# Altium footprint library Custom_Library.PcbLib: 221 footprints (part 11 of 14)
Each footprint in its own frame and in the unit in brackets; x right, y up, seen from the top. Pads: shape width x height; smd on the part's side, far side on the other; paste and mask are expansions set on the pad; w line width, h text height; cw(c..) or ccw(c..) is an arc to the next point about the centre after c.
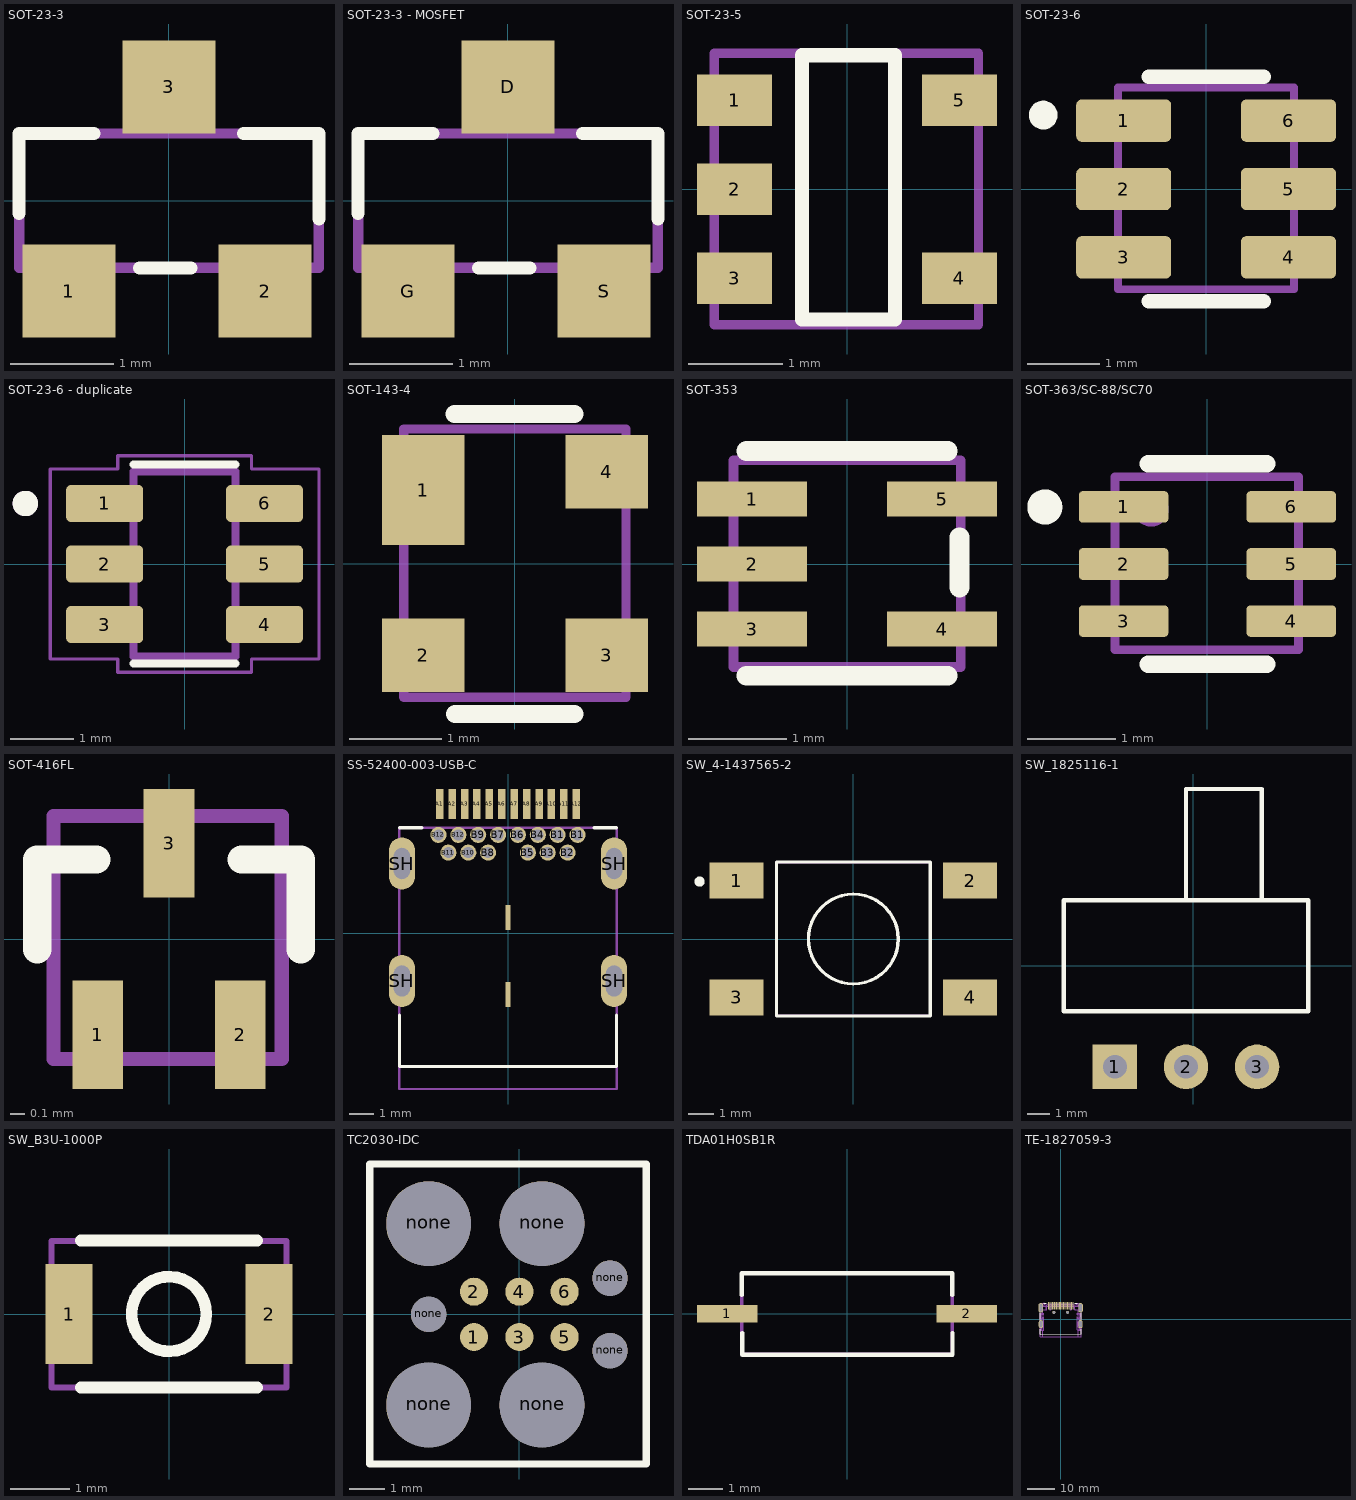
[diagram p10: the footprints below, top view; thin cyan lines are the x and y axes]

## SOT-23-3 [mm]
pads (3):
  rect 0.9x0.9 smd: 1(-0.969,-0.876) 2(0.931,-0.876) 3(0,1.1)
Top Overlay:
  lines w0.127: -1.451,-0.126 -1.451,0.65 -0.725,0.65 ; -0.285,-0.655 0.215,-0.655 ; 0.725,0.65 1.454,0.65 1.454,-0.176
Top Assembly:
  lines w0.1: -1.45,-0.65 -1.45,0.65 1.45,0.65 1.45,-0.65 -1.45,-0.65
  text "'.Designator'" at -3.1,-2.5 h1.27
3D body "SOT23.STEP": height 1.2, standoff -0.02, extent -1.513,-1.11 1.487,1.142

## SOT-23-3 - MOSFET [mm]
pads (3):
  rect 0.9x0.9 smd: D(0,1.1) G(-0.969,-0.876) S(0.931,-0.876)
Top Overlay:
  lines w0.127: -1.451,-0.126 -1.451,0.65 -0.725,0.65 ; -0.285,-0.655 0.215,-0.655 ; 0.725,0.65 1.454,0.65 1.454,-0.176
Top Assembly:
  lines w0.1: -1.45,-0.65 -1.45,0.65 1.45,0.65 1.45,-0.65 -1.45,-0.65
  text "'.Designator'" at -3.1,-2.5 h1.27
3D body "SOT23.STEP": height 1.2, standoff -0.02, extent -1.513,-1.11 1.487,1.142

## SOT-23-5 [mm] "SOT23, 5-Leads, Body 3.00x2.85mm, Pitch 0.95mm, IPC Medium Density"
height 1.3
pads (5):
  rect 0.8x0.55 smd: 1(-1.2,0.95) 2(-1.2,0) 3(-1.2,-0.95) 4(1.2,-0.95) 5(1.2,0.95)
Top Overlay:
  lines w0.15: -0.48,-1.39 -0.48,1.43 0.51,1.43 0.51,-1.39 -0.48,-1.39
Top Assembly:
  lines w0.1: -1.415,-1.445 1.402,-1.445 1.402,1.451 -1.415,1.451 -1.415,-1.445
  text "'.Designator'" at -2.937,-2.49 h1.27
3D body "SOT-23-5.STEP": height 1.5, standoff 0, extent -1.41,-1.45 1.411,1.45

## SOT-23-6 [mm]
pads (6):
  rrect25% 1.32x0.59 smd: 1(-1.145,0.95) 2(-1.145,0) 3(-1.145,-0.95) 4(1.145,-0.95) 5(1.145,0) 6(1.145,0.95)
Top Overlay:
  circle w0.2: c-2.264,1.027 r0.1
  lines w0.2: -0.8,-1.56 0.8,-1.56 ; -0.8,1.56 0.8,1.56
Top Assembly:
  circle w0.2: c-0.793,0.967 r0.1
  lines w0.11: -1.222,-1.393 1.221,-1.393 1.221,1.413 -1.207,1.413 -1.222,1.413 -1.222,-1.393
  text "'.Designator'" at -3.613,-2.754 h1.27
3D body "User Library-SOT23-6-1.STEP": height 1.09, standoff 0, extent -1.211,-1.389 1.215,1.405

## SOT-23-6 - duplicate [mm] "0.075-1.7A adj. ILIMIT, 2.5-6.5V, 85mΩ USB power switch, active-high, reverse blocking"
pads (6):
  rrect25% 1.21x0.58 smd: 1(-1.255,0.95) 2(-1.255,0) 3(-1.255,-0.95) 4(1.255,-0.95) 5(1.255,0) 6(1.255,0.95)
Top Overlay:
  circle w0.2: c-2.5,0.95 r0.1
  lines w0.127: -0.8,-1.56 0.8,-1.56 ; -0.8,1.56 0.8,1.56
Mechanical 13:
  circle w0.2: c-2.5,0.95 r0.1
  lines w0.127: -0.8,-1.45 -0.8,1.45 0.8,1.45 0.8,-1.45 -0.8,-1.45
Mechanical 15:
  lines w0.05: -2.11,-1.49 -2.11,1.49 -1.05,1.49 -1.05,1.7 1.05,1.7 1.05,1.49 2.11,1.49 2.11,-1.49 1.05,-1.49 1.05,-1.7 -1.05,-1.7 -1.05,-1.49 -2.11,-1.49
3D body "step_temp.STEP": height 1.45, standoff 0, extent -1.4,-1.45 1.4,1.45

## SOT-143-4 [mm]
pads (4):
  rect 0.9x1.2 smd: 1(-1,0.8)
  rect 0.9x0.8 smd: 2(-1,-1) 3(1,-1) 4(1,1)
Top Overlay:
  lines w0.2: -0.654,1.63 0.646,1.63 ; -0.65,-1.639 0.65,-1.639
Top Assembly:
  lines w0.1: -1.211,-1.457 1.21,-1.457 1.21,1.468 0.006,1.468 -1.211,1.468 -1.211,-1.457
  text "'.Designator'" at -3.013,-2.754 h1.27
3D body "User Library-sot143.STEP": height 1, standoff 0, extent -1.21,-1.46 1.21,1.46

## SOT-353 [mil]
pads (5):
  rect 44x14 smd: 1(-38,26) 2(-38,0) 3(-38,-26) 4(38,-26) 5(38,26)
Top Overlay:
  lines w7.87: -40.17,-44.71 40.27,-44.71 ; -40.17,45.2 40.27,45.2 ; 45.02,-9.43 45.02,10.68
Top Assembly:
  lines w3.94: -45.44,-41.22 45.53,-41.22 45.53,41.49 -45.44,41.49 -45.44,-41.22
  text "'.Designator'" at -135.3,-87.89 h50
3D body "User Library-sot353.STEP": height 39.37, standoff 0, extent -45.28,-41.34 45.28,41.34

## SOT-363/SC-88/SC70 [mm]
pads (6):
  rrect25% 1.02x0.36 smd: 1(-0.955,0.65) 2(-0.955,0) 3(-0.955,-0.65) 4(0.955,-0.65) 5(0.955,0) 6(0.955,0.65)
Top Overlay:
  circle w0.2: c-1.852,0.648 r0.1
  lines w0.2: -0.675,-1.144 0.675,-1.144 ; -0.675,1.144 0.675,1.144
Top Assembly:
  circle w0.2: c-0.643,0.626 r0.1
  lines w0.1: -1.054,-0.976 -1.054,0.995 0.839,0.995 1.037,0.995 1.037,-0.976 -1.054,-0.976
  text "'.Designator'" at -3.185,-2.438 h1.27
3D body "NCS210SQT2G.STEP": height 1, standoff -0.1, extent -1.05,-1 1.05,1

## SOT-416FL [mil]
pads (3):
  rect 14x30 smd paste+0: 1(-19.68,-26.5) 2(19.68,-26.5) 3(0,26.5)
Top Overlay:
  lines w7.87: -36.5,-2.82 -36.5,22 -20.1,22 ; 20.1,22 36.5,22 36.5,-2.82
Top Assembly:
  lines w3.94: -31.97,-33.23 -31.97,34.02 31.22,34.02 31.22,-33.23 -31.97,-33.23
  text "'.Designator'" at -122.95,-84.13 h50
3D body "TRANS_2SC4617EB_ROM.step": height 35.12, standoff 0, extent -31.5,-33.5 31.5,33.5
3D body: height 10, standoff 0, extent 0,0 10,10

## SS-52400-003-USB-C [mm]
pads (32):
  rect 0.3x1.2 smd: A1(-2.75,5.21) A2(-2.25,5.21) A3(-1.75,5.21) A4(-1.25,5.21) A5(-0.75,5.21) A6(-0.25,5.21) A7(0.25,5.21) A8(0.75,5.21) A9(1.25,5.21) A10(1.75,5.21) A11(2.25,5.21) A12(2.75,5.21)
  round 0.65 hole 0.45: B1(2,3.96) B1(2.8,3.96) B2(2.4,3.25) B3(1.6,3.25) B4(1.2,3.96) B5(0.8,3.25) B6(0.4,3.96) B7(-0.4,3.96) B8(-0.8,3.25) B9(-1.2,3.96) B10(-1.6,3.25) B11(-2.4,3.25) B12(-2.8,3.96) B12(-2,3.96)
  oval 1.05x2.1 hole 0.65 slot 1.25 at 90 deg: SH(-4.27,-1.92) SH(-4.27,2.81) SH(4.27,-1.92) SH(4.27,2.81)
  rect 0.2x1 smd: SH(0,-2.47) SH(0,0.63)
Top Overlay:
  lines w0.127: -4.37,-3.29 -4.37,-5.37 4.37,-5.37 4.37,-3.29 ; -4.37,4.247 -3.47,4.247 ; 3.47,4.247 4.37,4.247
Top Assembly:
  lines w0.1: -4.37,-3.77 -4.37,4.255 3.271,4.255 4.37,4.255 4.37,-3.77 4.37,-6.27 -4.37,-6.27 -4.37,-3.448 ; -4.358,-5.371 4.337,-5.366
  text "'.Designator'" at -3.209,-7.464 h1.27
3D body "SS-52400-003--3DModel-STEP-56544.STEP": height 3.04, standoff -1.82, extent -4.37,-6.311 4.37,5.519

## SW_4-1437565-2 [mm]
pads (4):
  rect 2.1x1.4 smd: 1(-4.55,2.275) 2(4.55,2.275) 3(-4.55,-2.275) 4(4.55,-2.275)
Top Overlay:
  circle w0.127: c0,0 r1.75
  circle w0.2: c-5.995,2.237 r0.1
  lines w0.127: -3,-2.997 -3,2.997 3.002,2.997 3.002,-3 -2.992,-3
Top Assembly:
  lines w0.1: -3,-3 3,-3 3,3 -3,3 -3,-3
  text "'.Designator'" at -3.286,-4.739 h1.27
3D body "FSM4JSMATR--3DModel-STEP-56544.STEP": height 5.18, standoff 0.05, extent -5,-3 5,3

## SW_1825116-1 [mm]
pads (3):
  rect 2x2 hole 1.07: 1(-3.516,-4.547)
  round 2 hole 1.07: 2(-0.316,-4.547) 3(2.884,-4.547)
Top Overlay:
  lines w0.2: -0.316,3.073 -0.316,7.953 3.084,7.953 3.084,3.073 ; 0.764,-2.047 1.814,-2.047 ; -5.816,-2.047 5.184,-2.047 5.184,2.953 -5.816,2.953 -5.816,-2.047
3D body "1825116-1.stp": height 5.7, standoff -4.07, extent -5.824,-4.778 5.176,7.722

## SW_B3U-1000P [mm]
pads (2):
  rect 0.8x1.7 smd: 1(-1.7,0) 2(1.7,0)
Top Overlay:
  circle w0.2: c0,0 r0.635
  lines w0.2: -1.5,-1.25 1.5,-1.25 ; -1.5,1.25 1.5,1.25
Top Assembly:
  lines w0.1: -2,0.46 -1.999,0.46 -1.999,-1.25 0.648,-1.25 2,-1.25 2,0.41 2,1.24 -2,1.24 -2,0.46
  text "'.Designator'" at -3.202,-2.481 h1.27
3D body "B3U-1000P--3DModel-STEP-56544.STEP": height 1.75, standoff 0, extent -2,-1.25 2,1.25

## TC2030-IDC [mil]
pads (13):
  round 31 smd paste-39.37: 1(-50,-25) 2(-50,25) 3(0,-25) 4(0,25) 5(50,-25) 6(50,25)
  round 93.5 hole 93.5 unplated: none(-100,-100) none(-100,100) none(25,-100) none(25,100)
  round 39 hole 39 unplated: none(-100,0) none(100,-40) none(100,40)
Top Overlay:
  lines w7.87: -165,-165 -165,165.8 -140.8,165.8 140,165.8 140,-165 -165,-165

## TDA01H0SB1R [mil]
pads (2):
  rect 70x20 smd: 1(-139,0) 2(139,0)
Top Overlay:
  lines w5: -122,21.88 -122,47 61.79,47 122,47 122,27.39 122,21.88 ; -121.6,-22.18 -121.6,-47.31 122.4,-47.31 122.4,-41.79 122.4,-22.18
Top Assembly:
  lines w3.94: -122,-47 122,-47 122,47 -122,47 -122,-47
  text "'.Designator'" at -135.23,-104.98 h50
3D body "TDA01H0SB1R.STEP": height 90.55, standoff 0, extent -159.84,-47.49 159.84,47

## TE-1827059-3 [mm]
pads (25):
  rect 0.3x2.6 smd: 1(4.5,5) 2(4,5) 3(3.5,5) 4(3,5) 5(2.5,5) 6(2,5) 7(1.5,5) 8(1,5) 9(0.5,5) 10(0,5) 11(-0.5,5) 12(-1,5) 13(-1.5,5) 14(-2,5) 15(-2.5,5) 16(-3,5) 17(-3.5,5) 18(-4,5) 19(-4.5,5)
  round 1.1 hole 1.1 unplated: none(-2.5,2.59) none(2.5,2.59)
  oval 1.5x3 hole 0.9 slot 2.1 at 90 deg: SH(-7.25,-1.72) SH(7.25,-1.72)
  oval 1.65x3.5 hole 0.9 slot 2.7 at 90 deg: SH(-7.25,4.24) SH(7.25,4.24)
Top Overlay:
  lines w0.127: -7.5,-5.334 -7.5,-3.55 ; -7.5,0.05 -7.5,2.25 ; -7.493,-5.334 7.493,-5.31 ; -6.122,5.9 -5.222,5.9 ; 5.191,5.9 6.091,5.9 ; 7.5,-5.31 7.5,-3.55 ; 7.5,0.05 7.5,2.25
Top Assembly:
  drawing of 4016 lines, arcs and shapes, not listed
  text "'.Designator'" at -3.1,-0.5 h1.27
3D body "1827059-3.STEP": height 6.08, standoff -2.2, extent -7.504,-6.321 7.497,5.779